# Altium footprint library PcbLib1.PcbLib: 49 footprints (part 2 of 4)
Each footprint in its own frame and in the unit in brackets; x right, y up, seen from the top. Pads: shape width x height; smd on the part's side, far side on the other; paste and mask are expansions set on the pad; w line width, h text height; cw(c..) or ccw(c..) is an arc to the next point about the centre after c.
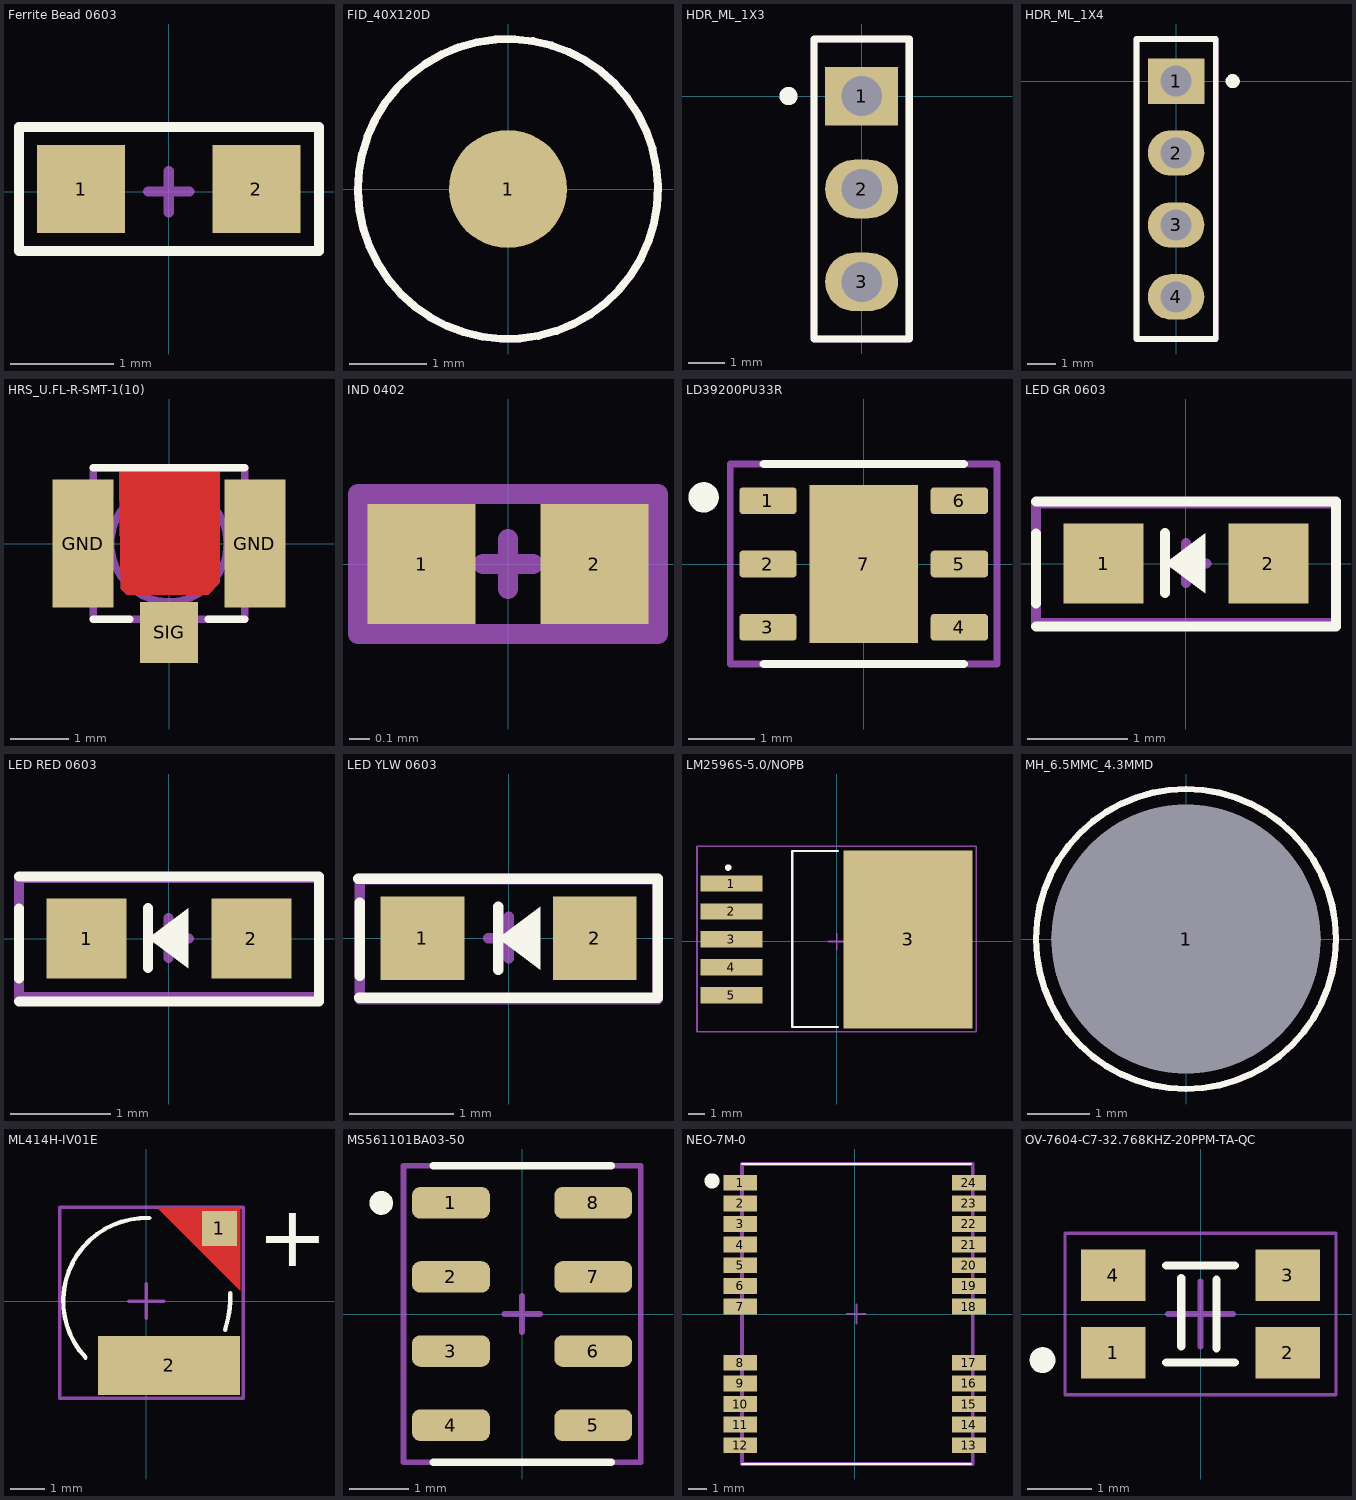
[diagram p1: the footprints below, top view; thin cyan lines are the x and y axes]

## Ferrite Bead 0603 [mm]
pads (2):
  rect 0.85x0.85 smd mask+0.05: 1(-0.85,0.025) 2(0.85,0.025)
Top Overlay:
  lines w0.1: -1.452,-0.575 -1.452,0.625 1.456,0.625 1.456,-0.575 -1.452,-0.575
Bottom 3D Body:
  lines w0.1: -0.2,0 0.2,0 ; 0,-0.2 0,0.2 ; -1.452,-0.575 -1.452,0.625 1.456,0.625 1.456,-0.575 -1.452,-0.575
Bottom Component Center:
  lines w0.1: -1.452,-0.575 -1.452,0.625 1.456,0.625 1.456,-0.575 -1.452,-0.575
  text "'.Designator'" at -1.3,-0.4 h0.4
3D body "User Library-FB_1608-1.STEP": height 0.8, standoff 0, extent -0.8,-0.375 0.8,0.425

## FID_40X120D [mil]
pads (1):
  round 60 smd paste-1574.8 mask+40: 1(0,0)
Top Overlay:
  lines w3.94: 76.11,0.98 cw(c0,0) 76.1,1.71
Bottom 3D Body:
  lines w3.94: -19.68,0 19.68,0 ; 0,-19.68 0,19.68 ; 76.11,0.98 cw(c0,0) 76.1,1.71
Bottom Component Center:
  lines w3.94: 76.11,0.98 cw(c0,0) 76.1,1.71
  text "'.Designator'" at -66.93,-15.75 h15.75

## HDR_ML_1X3 [mm]
pads (3):
  rect 2x1.6 hole 1.1: 1(0,0)
  oval 2x1.6 hole 1.1: 2(0,-2.54) 3(0,-5.08)
Top Overlay:
  circle w0.3: c-2,0 r0.1
  lines w0.2: -0.6,1.56 0,1.56 ; -0.5,-6.64 0,-6.64 ; -1.3,-6.64 1.3,-6.64 1.3,1.56 -1.3,1.56 -1.3,-6.64
Bottom 3D Body:
  lines w0.1: -0.5,0 0.5,0 ; 0,-0.5 0,0.5
  lines w0.2: -0.6,1.56 0,1.56 ; -0.5,-6.64 0,-6.64 ; -1.3,-6.64 -1.3,1.56 1.3,1.56 1.3,-6.64 -1.3,-6.64
Bottom Component Center:
  lines w0.2: -0.6,1.56 0,1.56 ; -0.5,-6.64 0,-6.64 ; -1.3,-6.64 -1.3,1.56 1.3,1.56 1.3,-6.64 -1.3,-6.64
  text "'.Designator'" at 0.6,-5.5 h0.7
3D body "3X1.stp": height 8.65, standoff -3.03, extent -1.24,-6.31 1.3,1.31

## HDR_ML_1X4 [mm]
pads (4):
  rect 2x1.6 hole 1.1: 1(0,0)
  oval 2x1.6 hole 1.1: 2(0,-2.54) 3(0,-5.08) 4(0,-7.62)
Top Overlay:
  circle w0.3: c2,0 r0.1
  lines w0.2: -1.4,-9.11 1.4,-9.11 1.4,1.49 -1.4,1.49 -1.4,-9.11
Bottom 3D Body:
  lines w0.1: -0.5,0 0.5,0 ; 0,-0.5 0,0.5
  lines w0.2: -1.4,-9.11 1.4,-9.11 1.4,1.49 -1.4,1.49 -1.4,-9.11
Bottom Component Center:
  lines w0.2: -1.4,-9.11 1.4,-9.11 1.4,1.49 -1.4,1.49 -1.4,-9.11
  text "'.Designator'" at 0.7,-7.7 h0.7
3D body "1x4.stp": height 9.55, standoff -3.05, extent -1.27,-8.885 1.27,1.275

## HRS_U.FL-R-SMT-1(10) [mm]
pads (3):
  rect 1.05x2.2 smd mask+0.05: GND(-1.475,0) GND(1.475,0)
  rect 1x1.05 smd mask+0.05: SIG(0,-1.525)
Top Layer:
  pour cut-out: -0.85,1.025 -0.85,1.225 -0.725,1.35 0.775,1.35 0.875,1.25 0.875,-0.675 0.675,-0.875 -0.725,-0.875 -0.825,-0.775
Bottom Layer:
  pour cut-out: -0.85,1.025 -0.85,1.225 -0.725,1.35 0.775,1.35 0.875,1.25 0.875,-0.675 0.675,-0.875 -0.725,-0.875 -0.825,-0.775
Top Overlay:
  lines w0.127: -1.3,-1.3 -0.67,-1.3 ; -1.3,1.3 1.3,1.3 ; 0.67,-1.3 1.3,-1.3
Bottom 3D Body:
  circle w0.127: c0,0 r1
  lines w0.127: -1.3,-1.3 -1.3,1.3 1.3,1.3 1.3,-1.3 -1.3,-1.3
3D body "u_fl-r-smt-1_10_.stp": height 1.26, standoff 0.01, extent -1.524,-1.677 1.476,1.423

## IND 0402 [mm]
pads (2):
  rect 0.54x0.6 smd mask+0.05: 1(-0.432,0) 2(0.432,0)
Top Component Center:
  lines w0.1: -0.125,0 0.125,0 ; 0,-0.125 0,0.125 ; -0.75,-0.35 0.75,-0.35 0.75,0.35 -0.75,0.35 -0.75,-0.35
Top Designator:
  lines w0.1: -0.75,-0.35 -0.75,0.35 0.75,0.35 0.75,-0.35 -0.75,-0.35
  text "'.Designator'" at -0.652,-0.246 h0.25
3D body "LQG15HS27NJ02D.STEP": height 0.56, standoff 0.01, extent -0.5,-0.25 0.5,0.25

## LD39200PU33R [mm]
pads (7):
  rrect25% 0.86x0.4 smd mask+0.06: 1(-1.435,0.95) 2(-1.435,0) 3(-1.435,-0.95) 4(1.435,-0.95) 5(1.435,0) 6(1.435,0.95)
  rect 1.63x2.37 smd paste-2 mask+0.06: 7(0,0)
Top Overlay:
  circle w0.254: c-2.4,1 r0.1
  lines w0.127: -1.5,-1.5 1.5,-1.5 ; -1.5,1.5 1.5,1.5
Bottom 3D Body:
  lines w0.1: -0.5,0 0.5,0 ; 0,-0.5 0,0.5 ; -2,-1.5 2,-1.5 2,1.5 -2,1.5 -2,-1.5
Bottom Component Center:
  lines w0.1: -2,-1.5 2,-1.5 2,1.5 -2,1.5 -2,-1.5
  text "'.Designator'" at -1.8,-0.6 h0.7
3D body "LD39200PU33R.STEP": height 1.01, standoff 0.01, extent -1.5,-1.5 1.5,1.5

## LED GR 0603 [mm]
pads (2):
  rect 0.8x0.8 smd mask+0.05: 1(-0.825,0) 2(0.825,0)
Top Overlay:
  region: 0.192,0.307 0.192,-0.293 -0.208,0.007
  lines w0.1: -1.5,-0.627 1.5,-0.627 1.5,0.622 -1.5,0.622 ; -1.5,-0.4 -1.5,0.3 ; -0.208,-0.293 -0.208,0.307
Bottom 3D Body:
  lines w0.1: -0.197,0 0.203,0 ; 0,-0.193 0,0.207 ; -1.5,-0.593 -1.5,0.607 1.5,0.607 1.5,-0.593 -1.5,-0.593
Bottom Component Center:
  lines w0.1: -1.5,-0.6 -1.5,0.6 1.5,0.6 1.5,-0.6 -1.5,-0.6
  text "'.Designator'" at -1.3,-0.5 h0.5
3D body "STP_150060xS75000 (rev1).stp": height 0.7, standoff 0, extent -0.9,-0.4 0.7,0.4

## LED RED 0603 [mm]
pads (2):
  rect 0.8x0.8 smd mask+0.05: 1(-0.825,0) 2(0.825,0)
Top Overlay:
  region: 0.192,0.307 0.192,-0.293 -0.208,0.007
  lines w0.1: -1.5,-0.627 1.5,-0.627 1.5,0.622 -1.5,0.622 ; -1.5,-0.4 -1.5,0.3 ; -0.208,-0.293 -0.208,0.307
Bottom 3D Body:
  lines w0.1: -0.2,0 0.2,0 ; -0.003,-0.193 -0.003,0.207 ; -1.5,-0.585 1.5,-0.585 1.5,0.615 -1.5,0.615 -1.5,-0.585
Bottom Component Center:
  lines w0.1: -1.5,-0.593 1.5,-0.593 1.5,0.607 -1.5,0.607 -1.5,-0.593
  text "'.Designator'" at -1.3,-0.493 h0.5
3D body "LED RED 0603.stp": height 0.7, standoff 0, extent -0.8,-0.4 0.8,0.4

## LED YLW 0603 [mm]
pads (2):
  rect 0.8x0.8 smd mask+0.05: 1(-0.825,0) 2(0.825,0)
Top Overlay:
  region: 0.3,0.3 0.3,-0.3 -0.1,0
  lines w0.1: -1.442,0.568 1.426,0.568 1.426,-0.569 -1.431,-0.569 ; -1.427,-0.358 -1.427,0.342 ; -0.1,-0.3 -0.1,0.3
Bottom 3D Body:
  lines w0.1: -0.197,0 0.203,0 ; 0,-0.193 0,0.207 ; -1.427,-0.585 1.426,-0.585 1.426,0.564 -1.427,0.564 -1.427,-0.585
Bottom Component Center:
  lines w0.1: -1.423,-0.581 -1.423,0.572 1.429,0.572 1.429,-0.581 -1.423,-0.581
  text "'.Designator'" at -1.3,-0.4 h0.4
3D body "APTD1608.sldprt": height 0.96, standoff 0.01, extent -0.8,-0.4 0.8,0.4

## LM2596S-5.0/NOPB [mm]
pads (6):
  rect 3.79x0.99 smd: 1(-6.4,3.527) 2(-6.4,1.827) 3(-6.4,0.127) 4(-6.4,-1.573) 5(-6.4,-3.273)
  rect 7.88x10.84 smd paste-6: 3(4.35,0.127)
Top Overlay:
  circle w0.2: c-6.6,4.5 r0.1
  lines w0.127: 0.09,-5.2 -2.7,-5.2 -2.7,5.5 0.09,5.5
Bottom 3D Body:
  lines w0.1: -0.5,0 0.5,0 ; 0,-0.5 0,0.5 ; -8.5,-5.5 -8.5,5.8 8.5,5.8 8.5,-5.5 -8.5,-5.5
Bottom Component Center:
  lines w0.1: -8.5,-5.5 -8.5,5.8 8.5,5.8 8.5,-5.5 -8.5,-5.5
  text "'.Designator'" at -7.4,-1.7 h2
3D body "LM2596S-5.0NOPB.STEP": height 4.66, standoff -0.14, extent -7.175,-4.98 7.175,5.18

## MH_6.5MMC_4.3MMD [mm]
pads (1):
  round 4.3 hole 4.3 mask+0: 1(0,0)
Top Overlay:
  circle w0.1: c0,0 r2.4
Bottom 3D Body:
  circle w0.1: c0,0 r2.4
  lines w0.1: -0.5,0 0.5,0 ; 0,-0.5 0,0.5
Bottom Component Center:
  circle w0.1: c0,0 r2.4
  text "'.Designator'" at -3.2,-1.4 h1.5

## ML414H-IV01E [mm]
pads (2):
  rect 1x1 smd paste-1 mask+0: 1(2.108,2.095)
  rect 4.1x1.7 smd: 2(0.658,-1.855)
Top Layer:
  region: 2.708,0.295 0.308,2.695 2.708,2.695
Top Overlay:
  lines w0.127: -1.752,-1.634 cw(c0,0) 0.084,2.394 ; 2.271,-0.827 ccw(c-0.626,0.114) 2.418,0.22
  text "+" at 3.2,1 h1.78
Bottom 3D Body:
  lines w0.1: -0.5,0 0.5,0 ; 0,-0.5 0,0.5 ; -2.5,-2.8 -2.5,2.7 0.3,2.7 2.8,2.7 2.8,-2.8 -2.5,-2.8
Bottom Component Center:
  lines w0.1: -2.5,-2.8 -2.5,2.7 0.3,2.7 2.8,2.7 2.8,-2.8 -2.5,-2.8
  text "'.Designator'" at -2.4,-1.3 h1.3
3D body: height 1.4, standoff 0, extent -2.4,-2.4 2.4,2.4

## MS561101BA03-50 [mm]
pads (8):
  rrect50% 1.31x0.53 smd: 1(-1.2,1.875) 2(-1.2,0.625) 3(-1.2,-0.625) 4(-1.2,-1.875) 5(1.2,-1.875) 6(1.2,-0.625) 7(1.2,0.625) 8(1.2,1.875)
Top Overlay:
  circle w0.2: c-2.377,1.873 r0.1
  lines w0.127: -1.5,-2.5 1.5,-2.5 ; -1.5,2.5 1.5,2.5
Bottom 3D Body:
  lines w0.1: -0.3,0 0.3,0 ; 0,-0.3 0,0.3 ; -2,-2.5 -2,2.5 2,2.5 2,-2.5 -2,-2.5
Bottom Component Center:
  lines w0.1: -2,-2.5 2,-2.5 2,2.5 -2,2.5 -2,-2.5
  text "'.Designator'" at -1.9,-0.9 h1
3D body "ms5611_STEP.step": height 1.04, standoff 0.01, extent -1.5,-2.5 1.5,2.5

## NEO-7M-0 [mm]
pads (24):
  rect 1.8x0.85 smd: 1(-6.1,7) 2(-6.1,5.9) 3(-6.1,4.8) 4(-6.1,3.7) 5(-6.1,2.6) 6(-6.1,1.5) 7(-6.1,0.4) 8(-6.1,-2.6) 9(-6.1,-3.7) 10(-6.1,-4.8) 11(-6.1,-5.9) 12(-6.1,-7) 13(6.1,-7) 14(6.1,-5.9) 15(6.1,-4.8) 16(6.1,-3.7) 17(6.1,-2.6) 18(6.1,0.4) 19(6.1,1.5) 20(6.1,2.6) 21(6.1,3.7) 22(6.1,4.8) 23(6.1,5.9) 24(6.1,7)
Top Overlay:
  circle w0.406: c-7.6,7.1 r0.2
  lines w0.127: -6,-8 6.2,-8 ; -6,8 6.2,8
Top Component Center:
  lines w0.1: -0.4,0 0.6,0 ; 0.1,-0.5 0.1,0.5
  lines w0.2: -6,-8 -6,8 6.3,8 6.3,-8 -6,-8
Top Designator:
  lines w0.2: -6,-8 -6,8 6.3,8 6.3,-8 -6,-8
  text "'.Designator'" at 2,-7.63 h2
3D body "NEO-7M-0.STEP": height 2.61, standoff 0.01, extent -6,-8 6.2,8

## OV-7604-C7-32.768KHZ-20PPM-TA-QC [mm]
pads (4):
  rect 1x0.8 smd mask+0.075: 1(-1.35,-0.6) 2(1.35,-0.6) 3(1.35,0.6) 4(-1.35,0.6)
Top Overlay:
  circle w0.2: c-2.45,-0.715 r0.1
  lines w0.127: -0.53,-0.75 0.53,-0.75 ; -0.53,0.75 0.53,0.75 ; -0.3,-0.5 -0.3,0.56 ; 0.25,-0.53 0.25,0.53
Bottom 3D Body:
  lines w0.05: -2.1,-1.25 -2.1,1.25 2.1,1.25 2.1,-1.25 -2.1,-1.25
  lines w0.1: -0.5,0 0.5,0 ; 0,-0.5 0,0.5
Bottom Component Center:
  lines w0.05: -2.1,-1.25 -2.1,1.25 2.1,1.25 2.1,-1.25 -2.1,-1.25
  text "'.Designator'" at -2.1,-0.8 h0.8
3D body "OV-7604-C7.STEP": height 1.01, standoff 0.01, extent -1.6,-0.75 1.6,0.75